# Altium footprint library Display.PcbLib: 16 footprints
Each footprint in its own frame and in the unit in brackets; x right, y up, seen from the top. Pads: shape width x height; smd on the part's side, far side on the other; paste and mask are expansions set on the pad; w line width, h text height; cw(c..) or ccw(c..) is an arc to the next point about the centre after c.
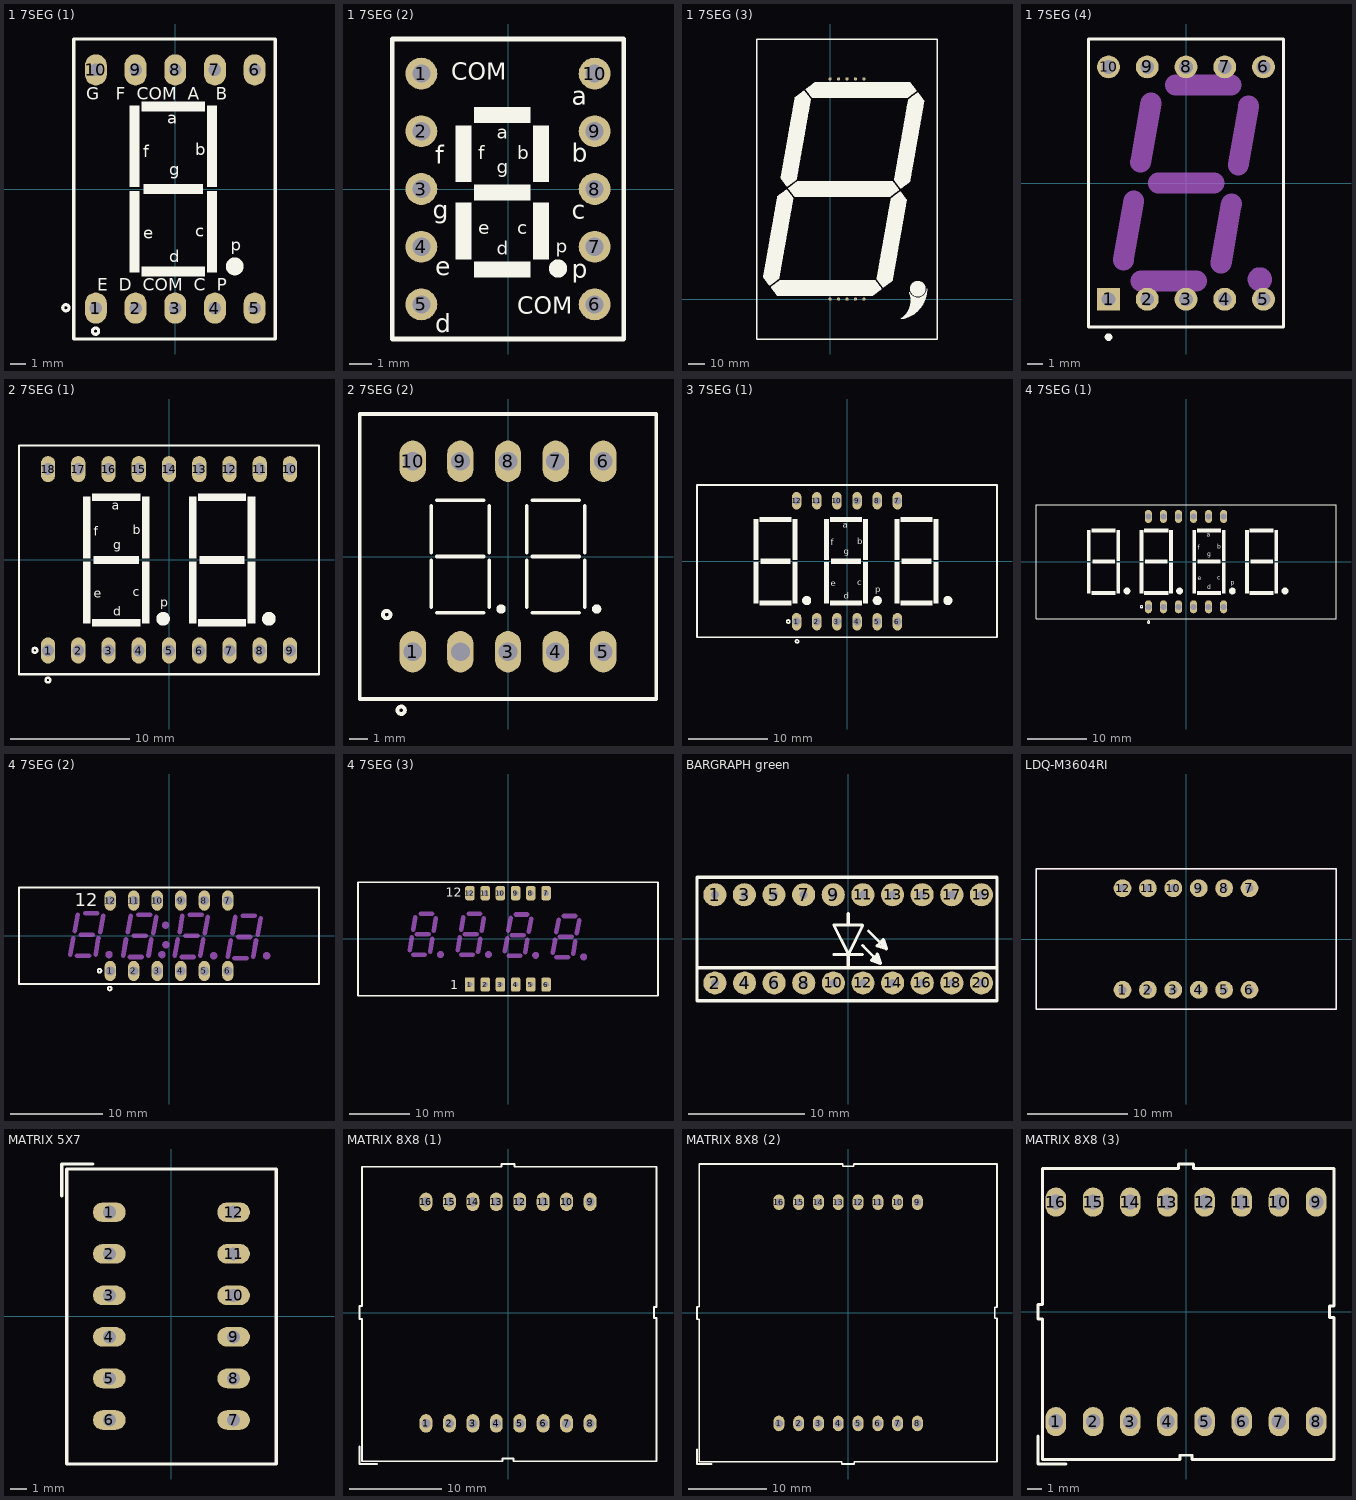
[diagram p0: the footprints below, top view; thin cyan lines are the x and y axes]

## 1 7SEG (1) [mm] "7SEG single 10pin Pitch: 2.54mm  19X12.5mm"
pads (10):
  oval 1.4x2 hole 0.8: 1(-5.08,-7.62) 2(-2.54,-7.62) 3(0,-7.62) 4(2.54,-7.62) 5(5.08,-7.62) 6(5.08,7.62) 7(2.54,7.62) 8(0,7.62) 9(-2.54,7.62) 10(-5.08,7.62)
Top Overlay:
  circle w0.2: c-5.1,-9.1 r0.2
  circle w0.2: c-7,-7.6 r0.2
  circle w0.635: c3.81,-4.953 r0.254
  rectangle: -2.921,-5.334 -2.286,-0.127
  rectangle: -2.921,0.127 -2.286,5.334
  rectangle: 2.032,0.127 2.667,5.334
  rectangle: 2.032,-5.334 2.667,-0.127
  rectangle: -2.159,4.953 1.905,5.588
  rectangle: -2.159,-5.588 1.905,-4.953
  rectangle: -2.032,-0.33 1.778,0.33
  lines w0.2: -6.5,-9.6 -6.5,9.6 6.4,9.6 6.4,-9.6 -6.5,-9.6
  text "E  D  COM  C  P" at -5,-6.5 h0.8
  text "G   F  COM  A   B" at -5.7,5.7 h0.8
  text "a" at -0.508,4.191 h0.76
  text "f" at -2.032,2.032 h0.76
  text "d" at -0.381,-4.699 h0.76
  text "c" at 1.27,-3.048 h0.76
  text "e" at -2.032,-3.175 h0.76
  text "b" at 1.27,2.159 h0.76
  text "p" at 3.556,-3.937 h0.76
  text "g" at -0.381,0.889 h0.76
3D body "User Library-KEM-5611.STEP": height 10, standoff -4.3, extent -6.3,-9.5 6.3,9.5

## 1 7SEG (2) [mm] "7SEG single 10pin Pitch: 2.54mm  3911 0.39\" 10X13mm"
pads (10):
  round 1.4 / inner round 1.4 / far side oval 2x1.4 hole 0.8: 1(-3.81,5.08) 2(-3.81,2.54) 3(-3.81,0) 4(-3.81,-2.54) 5(-3.81,-5.08) 6(3.81,-5.08) 7(3.81,-2.54) 8(3.81,0) 9(3.81,2.54) 10(3.81,5.08)
Top Overlay:
  circle w0.4: c2.2,-3.5 r0.2
  rectangle: -1.5,-0.5 1,0.2
  region: -1.6,0.3 -1.6,2.8 -2.3,2.8 -2.3,0.3
  rectangle: -1.5,2.9 1,3.6
  region: -2.3,-0.6 -2.3,-3.1 -1.6,-3.1 -1.6,-0.6
  region: 1.1,-0.6 1.1,-3.1 1.8,-3.1 1.8,-0.6
  region: 1.8,0.3 1.8,2.8 1.1,2.8 1.1,0.3
  rectangle: -1.5,-3.9 1,-3.2
  lines w0.2: -5.1,-6.6 -5.1,6.6 5.1,6.6 5.1,-6.6 -5.1,-6.6
  text "p" at 2.8,-3.9 h0.8
  text "a" at 2.8,3.7 h0.8
  text "d" at -3.2,-6.3 h0.8
  text "COM" at 0.4,-5.5 h0.76
  text "COM" at -2.5,4.8 h0.76
  text "e" at -3.2,-3.8 h0.8
  text "f" at -3.2,1.1 h0.8
  text "b" at 2.8,1.2 h0.8
  text "g" at -3.3,-1.3 h0.8
  text "c" at 2.8,-1.3 h0.8
  text "a" at -0.5,2.2 h0.6
  text "f" at -1.3,1.3 h0.6
  text "d" at -0.5,-2.9 h0.6
  text "c" at 0.4,-2 h0.6
  text "e" at -1.3,-2 h0.6
  text "b" at 0.4,1.3 h0.6
  text "p" at 2.1,-2.8 h0.6
  text "g" at -0.5,0.689 h0.6
3D body "User Library-King Bright SA39-11.step": height 7, standoff -4, extent -5,-6.5 5,6.5

## 1 7SEG (3) [mm]
pads (10):
  round 2 hole 0.85: 1(0,0) 2(5.08,0) 3(10.16,0) 4(15.24,0) 5(20.32,0) 6(20.32,132.004) 7(15.24,132.004) 8(10.16,132.004) 9(5.08,132.004) 10(0,132.004)
Top Overlay:
  drawing of 13 lines, arcs and shapes, not listed
3D body "7Segment.STEP": height 15.6, standoff -4.3, extent -43.85,-24 64.15,156

## 1 7SEG (4) [mm]
pads (10):
  rect 1.5x1.5 hole 0.9: 1(-5.08,-7.62)
  round 1.5 hole 0.9: 2(-2.54,-7.62) 3(0,-7.62) 4(2.54,-7.62) 5(5.08,-7.62) 6(5.08,7.62) 7(2.54,7.62) 8(0,7.62) 9(-2.54,7.62) 10(-5.08,7.62)
Top Overlay:
  circle w0.25: c-5.08,-10.1 r0.125
  lines w0.2: -6.4,-9.45 6.4,-9.45 6.4,9.45 -6.4,9.45 -6.4,-9.45
Mechanical 1:
  circle w1: c4.842,-6.316 r0.296
  lines w1.37: -4.108,-5.054 -3.425,-1.17 ; -2.974,1.368 -2.293,5.255 ; -2.958,-6.429 0.692,-6.426 ; -1.821,0 1.828,0 ; -0.689,6.425 2.96,6.425 ; 2.295,-5.256 2.98,-1.371 ; 3.427,1.169 4.11,5.058
Mechanical 13:
  lines w0.1: -6.4,-9.45 -6.4,9.45 6.4,9.45 6.4,-9.45 -6.4,-9.45
3D body "7 Segment.STEP": height 8.5, standoff -3, extent -6.147,-9.5 6.153,9.5

## 2 7SEG (1) [mm] "7SEG 2DIGIT 16pin Pitch: 2.54mm    5621 0.56\", 19X25mm"
height 8
pads (18):
  oval 1.2x2.2 hole 1: 1(-10.16,-7.62) 2(-7.62,-7.62) 3(-5.08,-7.62) 4(-2.54,-7.62) 5(0,-7.62) 6(2.54,-7.62) 7(5.08,-7.62) 8(7.62,-7.62) 9(10.16,-7.62) 10(10.16,7.62) 11(7.62,7.62) 12(5.08,7.62) 13(2.54,7.62) 14(0,7.62) 15(-2.54,7.62) 16(-5.08,7.62) 17(-7.62,7.62) 18(-10.16,7.62)
Top Overlay:
  circle w0.2: c-10.17,-10.1 r0.2
  circle w0.2: c-11.27,-7.6 r0.2
  circle w0.635: c8.39,-4.953 r0.254
  circle w0.635: c-0.5,-4.953 r0.254
  rectangle: 1.659,-5.334 2.294,-0.127
  rectangle: 1.659,0.127 2.294,5.334
  rectangle: 6.612,0.127 7.247,5.334
  rectangle: 6.612,-5.334 7.247,-0.127
  rectangle: 2.421,4.953 6.485,5.588
  rectangle: 2.421,-5.588 6.485,-4.953
  rectangle: 2.548,-0.33 6.358,0.33
  rectangle: -6.342,-0.33 -2.532,0.33
  rectangle: -6.469,-5.588 -2.405,-4.953
  rectangle: -6.469,4.953 -2.405,5.588
  rectangle: -2.278,-5.334 -1.643,-0.127
  rectangle: -2.278,0.127 -1.643,5.334
  rectangle: -7.231,0.127 -6.596,5.334
  rectangle: -7.231,-5.334 -6.596,-0.127
  lines w0.2: -12.6,-9.6 12.6,-9.6 12.6,9.6 -12.6,9.6 -12.6,-9.6
  text "g" at -4.691,0.889 h0.76
  text "p" at -0.754,-3.937 h0.76
  text "b" at -3.04,2.159 h0.76
  text "e" at -6.342,-3.175 h0.76
  text "c" at -3.04,-3.048 h0.76
  text "d" at -4.691,-4.699 h0.76
  text "f" at -6.342,2.032 h0.76
  text "a" at -4.818,4.191 h0.76
3D body "User Library-King Bright DX56_2DIG.step": height 8.2, standoff -3.8, extent -12.5,-9.525 12.5,9.525

## 2 7SEG (2) [mm] "7SEG 2DIGIT 10pin Pitch: 2.54mm  0.3\", 15.5X15mm"
height 8
pads (10):
  oval 1.4x2.2 hole 1: 1(-5.08,-5.08) 3(0,-5.08) 4(2.54,-5.08) 5(5.08,-5.08) 6(5.08,5.08) 7(2.54,5.08) 8(0,5.08) 9(-2.54,5.08) 10(-5.08,5.08) ""(-2.54,-5.08)
Top Overlay:
  circle w0.2: c-6.47,-3.1 r0.2
  circle w0.2: c-5.7,-8.2 r0.2
  circle w0.25: c-0.37,-2.8 r0.125
  circle w0.25: c4.73,-2.8 r0.125
  lines w0.2: -4.1,-2.7 -4.1,-0.2 ; -4.1,0.2 -4.1,2.7 ; -3.8,-3 -1.3,-3 ; -3.8,0 -1.3,0 ; -3.8,3 -1.3,3 ; -1,-2.7 -1,-0.2 ; -1,0.2 -1,2.7 ; 1,-2.7 1,-0.2 ; 1,0.2 1,2.7 ; 1.3,-3 3.8,-3 ; 1.3,0 3.8,0 ; 1.3,3 3.8,3 ; 4.1,-2.7 4.1,-0.2 ; 4.1,0.2 4.1,2.7 ; -7.9,-7.6 -7.9,7.6 7.9,7.6 7.9,-7.6 -7.9,-7.6
3D body "DX03-11.STEP": height 7.3, standoff -3.9, extent -7.75,-7.5 7.75,7.5

## 3 7SEG (1) [mm] "7SEG 3DIGIT 12pin Pitch: 2.54mm  5641 0.56\", 19X37.5mm"
height 7.62
pads (12):
  oval 1.2x2.2 hole 1: 1(-6.35,-7.62) 2(-3.81,-7.62) 3(-1.27,-7.62) 4(1.27,-7.62) 5(3.81,-7.62) 6(6.35,-7.62) 7(6.35,7.62) 8(3.81,7.62) 9(1.27,7.62) 10(-1.27,7.62) 11(-3.81,7.62) 12(-6.35,7.62)
Top Overlay:
  circle w0.2: c-6.3,-10.1 r0.2
  circle w0.2: c-7.4,-7.6 r0.2
  circle w0.635: c12.7,-4.953 r0.254
  circle w0.635: c-5.08,-4.953 r0.254
  circle w0.635: c3.81,-4.953 r0.254
  rectangle: 5.969,-5.334 6.604,-0.127
  rectangle: 5.969,0.127 6.604,5.334
  rectangle: 10.922,0.127 11.557,5.334
  rectangle: 10.922,-5.334 11.557,-0.127
  rectangle: 6.731,4.953 10.795,5.588
  rectangle: 6.731,-5.588 10.795,-4.953
  rectangle: 6.858,-0.33 10.668,0.33
  rectangle: -11.811,-5.334 -11.176,-0.127
  rectangle: -11.811,0.127 -11.176,5.334
  rectangle: -6.858,0.127 -6.223,5.334
  rectangle: -6.858,-5.334 -6.223,-0.127
  rectangle: -11.049,4.953 -6.985,5.588
  rectangle: -11.049,-5.588 -6.985,-4.953
  rectangle: -2.032,-0.33 1.778,0.33
  rectangle: -2.159,-5.588 1.905,-4.953
  rectangle: -2.159,4.953 1.905,5.588
  rectangle: 2.032,-5.334 2.667,-0.127
  rectangle: 2.032,0.127 2.667,5.334
  rectangle: -2.921,0.127 -2.286,5.334
  rectangle: -2.921,-5.334 -2.286,-0.127
  rectangle: -10.922,-0.33 -7.112,0.33
  lines w0.2: -18.9,-9.6 18.9,-9.6 18.9,9.6 -18.9,9.6 -18.9,-9.6
  text "g" at -0.381,0.889 h0.76
  text "p" at 3.556,-3.937 h0.76
  text "b" at 1.27,2.159 h0.76
  text "e" at -2.032,-3.175 h0.76
  text "c" at 1.27,-3.048 h0.76
  text "d" at -0.381,-4.699 h0.76
  text "f" at -2.032,2.032 h0.76
  text "a" at -0.508,4.191 h0.76
3D body "end-el-san Co Ltd-King Bright BX56-12A.step": height 8.2, standoff -3.9, extent -18.8,-9.5 18.8,9.5

## 4 7SEG (1) [mm] "7SEG 4DIGIT 12pin Pitch: 2.54mm    5641 0.56\", 19X50.3mm"
height 7.62
pads (12):
  oval 1.2x2.2 hole 1: 1(-6.35,-7.62) 2(-3.81,-7.62) 3(-1.27,-7.62) 4(1.27,-7.62) 5(3.81,-7.62) 6(6.35,-7.62) 7(6.35,7.62) 8(3.81,7.62) 9(1.27,7.62) 10(-1.27,7.62) 11(-3.81,7.62) 12(-6.35,7.62)
Top Overlay:
  circle w0.2: c-6.3,-10.2 r0.2
  circle w0.2: c-7.5,-7.6 r0.2
  circle w0.635: c7.81,-4.953 r0.254
  circle w0.635: c-1.08,-4.953 r0.254
  circle w0.635: c16.7,-4.953 r0.254
  circle w0.635: c-9.97,-4.953 r0.254
  rectangle: -6.922,-0.33 -3.112,0.33
  rectangle: 1.079,-5.334 1.714,-0.127
  rectangle: 1.079,0.127 1.714,5.334
  rectangle: 6.032,0.127 6.667,5.334
  rectangle: 6.032,-5.334 6.667,-0.127
  rectangle: 1.841,4.953 5.905,5.588
  rectangle: 1.841,-5.588 5.905,-4.953
  rectangle: 1.968,-0.33 5.778,0.33
  rectangle: -7.049,-5.588 -2.985,-4.953
  rectangle: -7.049,4.953 -2.985,5.588
  rectangle: -2.858,-5.334 -2.223,-0.127
  rectangle: -2.858,0.127 -2.223,5.334
  rectangle: -7.811,0.127 -7.176,5.334
  rectangle: -7.811,-5.334 -7.176,-0.127
  rectangle: 10.858,-0.33 14.668,0.33
  rectangle: 10.731,-5.588 14.795,-4.953
  rectangle: 10.731,4.953 14.795,5.588
  rectangle: 14.922,-5.334 15.557,-0.127
  rectangle: 14.922,0.127 15.557,5.334
  rectangle: 9.969,0.127 10.604,5.334
  rectangle: 9.969,-5.334 10.604,-0.127
  rectangle: -16.701,-5.334 -16.066,-0.127
  rectangle: -16.701,0.127 -16.066,5.334
  rectangle: -11.748,0.127 -11.113,5.334
  rectangle: -11.748,-5.334 -11.113,-0.127
  rectangle: -15.939,4.953 -11.875,5.588
  rectangle: -15.939,-5.588 -11.875,-4.953
  rectangle: -15.812,-0.33 -12.002,0.33
  lines w0.2: -25.3,-9.6 -25.3,9.6 25.3,9.6 25.3,-9.6 -25.3,-9.6
  text "a" at 3.492,4.191 h0.76
  text "f" at 1.968,2.032 h0.76
  text "d" at 3.619,-4.699 h0.76
  text "c" at 5.27,-3.048 h0.76
  text "e" at 1.968,-3.175 h0.76
  text "b" at 5.27,2.159 h0.76
  text "p" at 7.556,-3.937 h0.76
  text "g" at 3.619,0.889 h0.76
3D body "User Library-C-564 (7 segment 4 digit LED display).step": height 8, standoff -6.2, extent -25.2,-9.5 25.2,9.5

## 4 7SEG (2) [mm] "7SEG 4DIGIT ,0.28\", 12pin Pitch: 2.54mm, 10.2X32mm"
height 5.8
pads (12):
  oval 1.2x2.2 hole 1: 1(-6.35,-3.8) 2(-3.81,-3.8) 3(-1.27,-3.8) 4(1.27,-3.8) 5(3.81,-3.8) 6(6.35,-3.8) 7(6.35,3.8) 8(3.81,3.8) 9(1.27,3.8) 10(-1.27,3.8) 11(-3.81,3.8) 12(-6.35,3.8)
Top Overlay:
  circle w0.2: c-6.4,-5.7 r0.2
  circle w0.2: c-7.5,-3.78 r0.2
  lines w0.2: -16.2,-5.2 -16.2,5.2 16.2,5.2 16.2,-5.2 -16.2,-5.2
  text "12" at -10.16,3.175 h1.4
Mechanical 1:
  circle w0.5: c-0.381,1.143 r0.15
  circle w0.5: c-0.332,-0.967 r0.15
  circle w0.5: c10.541,-2.159 r0.15
  circle w0.5: c4.826,-2.159 r0.15
  circle w0.5: c-0.762,-2.032 r0.15
  circle w0.5: c-6.477,-2.032 r0.15
  lines w0.5: -10.668,-2.032 -10.358,-0.259 ; -10.16,0.508 -9.853,2.282 ; -9.942,-2.16 -8.642,-2.16 ; -9.525,0.127 -8.225,0.127 ; -9.047,2.413 -7.747,2.413 ; -7.928,-2.027 -7.62,-0.254 ; -7.428,0.387 -7.112,2.159 ; -4.953,-2.159 -4.643,-0.386 ; -4.445,0.381 -4.138,2.155 ; -4.227,-2.287 -2.927,-2.287 ; -3.81,0 -2.51,0 ; -3.332,2.286 -2.032,2.286 ; -2.213,-2.154 -1.905,-0.381 ; -1.713,0.26 -1.397,2.032 ; 0.635,-2.159 0.945,-0.386 ; 1.143,0.381 1.45,2.155 ; 1.361,-2.287 2.661,-2.287 ; 1.778,0 3.078,0 ; 2.256,2.286 3.556,2.286 ; 3.375,-2.154 3.683,-0.381 ; 3.875,0.26 4.191,2.032 ; 6.35,-2.286 6.66,-0.513 ; 6.858,0.254 7.165,2.028 ; 7.076,-2.414 8.376,-2.414 ; 7.493,-0.127 8.793,-0.127 ; 7.971,2.159 9.271,2.159 ; 9.09,-2.281 9.398,-0.508 ; 9.59,0.133 9.906,1.905
3D body "User Library-7seg4digit_028.step": height 5.8, standoff -5.7, extent -16,-5.05 16,5.05

## 4 7SEG (3) [mm] "7seg-CA; 12 Leads"
height 19
pads (12):
  rect 1.6x2.4 hole 0.9: 1(-6.35,-7.62)
  rrect50% 1.6x2.4 hole 0.9: 2(-3.81,-7.62) 3(-1.27,-7.62) 4(1.27,-7.62) 5(3.81,-7.62) 6(6.35,-7.62) 7(6.35,7.62) 8(3.81,7.62) 9(1.27,7.62) 10(-1.27,7.62) 11(-3.81,7.62) 12(-6.35,7.62)
Top Overlay:
  lines w0.254: 24.981,-9.525 -25.019,-9.525 -25.019,9.475 24.981,9.475 ; 25.019,-9.525 25.019,9.475
  text "1" at -9.652,-8.382 h1.52
  text "12" at -10.414,6.985 h1.52
Mechanical 1:
  circle w0.86: c-11.254,-2.618 r0.15
  circle w0.86: c-3.253,-2.618 r0.15
  circle w0.86: c4.621,-2.745 r0.15
  circle w0.86: c12.622,-2.999 r0.15
  lines w0.762: -16.414,-1.928 -16.034,0.242 ; -15.804,1.522 -15.444,3.602 ; -15.784,-2.668 -13.864,-2.668 ; -15.228,0.762 -13.22,0.762 ; -14.564,4.192 -12.674,4.192 ; -13.004,-2.128 -12.634,0.002 ; -12.404,1.322 -12.024,3.452 ; -8.413,-1.928 -8.033,0.242 ; -7.803,1.522 -7.443,3.602 ; -7.783,-2.668 -5.863,-2.668 ; -7.227,0.762 -5.219,0.762 ; -6.563,4.192 -4.673,4.192 ; -5.003,-2.128 -4.633,0.002 ; -4.403,1.322 -4.023,3.452 ; -0.539,-2.055 -0.159,0.115 ; 0.071,1.395 0.431,3.475 ; 0.091,-2.795 2.011,-2.795 ; 0.647,0.635 2.655,0.635 ; 1.311,4.065 3.201,4.065 ; 2.871,-2.255 3.241,-0.125 ; 3.471,1.195 3.851,3.325 ; 7.462,-2.309 7.842,-0.139 ; 8.072,1.141 8.432,3.221 ; 8.092,-3.049 10.012,-3.049 ; 8.648,0.381 10.656,0.381 ; 9.312,3.811 11.202,3.811 ; 10.872,-2.509 11.242,-0.379 ; 11.472,0.941 11.852,3.071
3D body "User Library-C-564 (7 segment 4 digit LED display).STEP": height 8, standoff -6.2, extent -25.2,-9.5 25.2,9.5

## BARGRAPH green [mm]
pads (20):
  round 2 hole 0.7: 1(-11.506,3.81) 2(-11.506,-3.81) 3(-8.966,3.81) 4(-8.949,-3.81) 5(-6.407,3.81) 6(-6.392,-3.81) 7(-3.848,3.81) 8(-3.835,-3.81) 9(-1.289,3.81) 10(-1.278,-3.81) 11(1.27,3.81) 12(1.278,-3.81) 13(3.829,3.81) 14(3.835,-3.81) 15(6.388,3.81) 16(6.392,-3.81) 17(8.947,3.81) 18(8.949,-3.81) 19(11.506,3.81) 20(11.506,-3.81)
Top Overlay:
  lines w0.254: -1.245,-1.346 1.254,-1.346 ; 1.254,-0.585 1.508,-0.839 2.778,-2.107 ; 1.762,0.683 2.016,0.429 3.287,-0.839 ; 2.016,-1.853 2.524,-1.346 2.016,-1.853 ; 2.016,-1.853 2.778,-2.107 ; 2.016,-1.853 2.778,-2.107 ; 2.524,-0.585 3.032,-0.078 2.524,-0.585 ; 2.524,-0.585 3.287,-0.839 ; 2.524,-0.585 3.287,-0.839 ; -1.245,1.19 0.025,-1.346 1.254,1.19 -1.245,1.19
  lines w0.3: -13.056,-2.489 12.725,-2.489 ; 0,1.219 0,2.184 ; 0.025,-2.311 0.025,-1.346 ; 2.016,-1.853 2.778,-2.107 2.524,-1.346 ; 2.524,-0.585 3.287,-0.839 3.032,-0.078 ; -13.056,-5.334 -13.056,5.309 12.852,5.309 12.852,-5.334 -13.056,-5.334
3D body "green-DC-10GWA.STEP": height 8, standoff -3, extent -12.801,-5.08 12.599,5.08

## LDQ-M3604RI [mil]
pads (12):
  round 70 hole 31.5: 1(-250,-200) 2(-150,-200) 3(-50,-200) 4(50,-200) 5(150,-200) 6(250,-200) 7(250,200) 8(150,200) 9(50,200) 10(-50,200) 11(-150,200) 12(-250,200)
Top Overlay:
  lines w5: -590.55,-275.59 -590.55,275.59 590.55,275.59 590.55,-275.59 -590.55,-275.59
Mechanical 13:
  lines w5: -590.55,-275.59 590.55,-275.59 590.55,275.59 -590.55,275.59 -590.55,-275.59
3D body "step_temp.STEP": height 283.46, standoff -240.16, extent -590.55,-275.59 590.55,275.59

## MATRIX 5X7 [mm] "LED Dot Matrix 5x7 12.7mmx17.8mm"
height 15.7
pads (12):
  oval 2x1.2 hole 0.8: 1(-3.8,6.35) 2(-3.8,3.81) 3(-3.8,1.27) 4(-3.8,-1.27) 5(-3.8,-3.81) 6(-3.8,-6.35) 7(3.8,-6.35) 8(3.8,-3.81) 9(3.8,-1.27) 10(3.8,1.27) 11(3.8,3.81) 12(3.8,6.35)
Top Overlay:
  lines w0.2: -6.7,7.36 -6.7,9.3 -4.8,9.3 ; -6.4,-9.04 -6.4,9 6.4,9 6.4,-9.04 -6.4,-9.04
3D body "User Library-18mm DOTMATRIX DISPLAY.step": height 6.4, standoff -5.5, extent -6.35,-8.89 6.35,8.89

## MATRIX 8X8 (1) [mm] "LED Dot Matrix 8x8 32mmx32mm"
height 15.7
pads (16):
  oval 1.4x2 hole 1: 1(-8.89,-12) 2(-6.35,-12) 3(-3.81,-12) 4(-1.27,-12) 5(1.27,-12) 6(3.81,-12) 7(6.35,-12) 8(8.89,-12) 9(8.89,12) 10(6.35,12) 11(3.81,12) 12(1.27,12) 13(-1.27,12) 14(-3.81,12) 15(-6.35,12) 16(-8.89,12)
Top Overlay:
  lines w0.2: -16.1,-14.5 -16.1,-16.4 -14.2,-16.4 ; -16.1,-0.7 -15.8,-0.7 -15.8,-16.1 -0.6,-16.1 -0.6,-15.8 0.6,-15.8 0.6,-16.1 16.1,-16.1 16.1,-0.6 15.8,-0.6 15.8,0.6 16.1,0.6 16.1,15.8 0.7,15.8 0.7,16.1 -0.7,16.1 -0.7,15.8 -15.8,15.8 -15.8,0.7 -16.1,0.7 -16.1,-0.7
3D body "User Library-Lite-On LTP-12088M.step": height 8, standoff -3.25, extent -15.964,-16 15.964,15.928

## MATRIX 8X8 (2) [mm] "LED Dot Matrix 8x8 38mmx38mm"
height 15.7
pads (16):
  oval 1.4x2 hole 1: 1(-8.89,-14.2) 2(-6.35,-14.2) 3(-3.81,-14.2) 4(-1.27,-14.2) 5(1.27,-14.2) 6(3.81,-14.2) 7(6.35,-14.2) 8(8.89,-14.2) 9(8.89,14.2) 10(6.35,14.2) 11(3.81,14.2) 12(1.27,14.2) 13(-1.27,14.2) 14(-3.81,14.2) 15(-6.35,14.2) 16(-8.89,14.2)
Top Overlay:
  lines w0.2: -19.4,-17.5 -19.4,-19.4 -17.5,-19.4 ; -19.4,-0.8 -19.1,-0.8 -19.1,-19.1 -0.8,-19.1 -0.8,-19.4 0.8,-19.4 0.8,-19.1 19.1,-19.1 19.1,-0.7 18.8,-0.7 18.8,0.7 19.1,0.7 19.1,19.1 0.7,19.1 0.7,18.8 -0.7,18.8 -0.7,19.1 -19.1,19.1 -19.1,0.8 -19.4,0.8 -19.4,-0.8
3D body "User Library-38x38_8x8_LED.step": height 10.4, standoff -4, extent -19.304,-19.277 18.996,19.023

## MATRIX 8X8 (3) [mm] "LED Dot Matrix 8x8 20mmx20mm"
height 15.7
pads (16):
  oval 1.4x2 hole 1: 1(-8.89,-7.5) 2(-6.35,-7.5) 3(-3.81,-7.5) 4(-1.27,-7.5) 5(1.27,-7.5) 6(3.81,-7.5) 7(6.35,-7.5) 8(8.89,-7.5) 9(8.89,7.5) 10(6.35,7.5) 11(3.81,7.5) 12(1.27,7.5) 13(-1.27,7.5) 14(-3.81,7.5) 15(-6.35,7.5) 16(-8.89,7.5)
Top Overlay:
  lines w0.2: -10.1,-8.5 -10.1,-10.4 -8.2,-10.4 ; -10.1,-0.5 -10.1,0.5 -9.8,0.5 -9.8,9.8 -0.5,9.8 -0.5,10.1 0.5,10.1 0.5,9.8 10.1,9.8 10.1,0.4 9.8,0.4 9.8,-0.4 10.1,-0.4 10.1,-10.1 0.4,-10.1 0.4,-9.8 -0.4,-9.8 -0.4,-10.1 -9.8,-10.1 -9.8,-0.5 -10.1,-0.5
3D body: height 5.46, standoff 2, extent -10,-10 10,10